# Altium footprint library PCB_Connector.PcbLib: 86 footprints (part 3 of 6)
Each footprint in its own frame and in the unit in brackets; x right, y up, seen from the top. Pads: shape width x height; smd on the part's side, far side on the other; paste and mask are expansions set on the pad; w line width, h text height; cw(c..) or ccw(c..) is an arc to the next point about the centre after c.
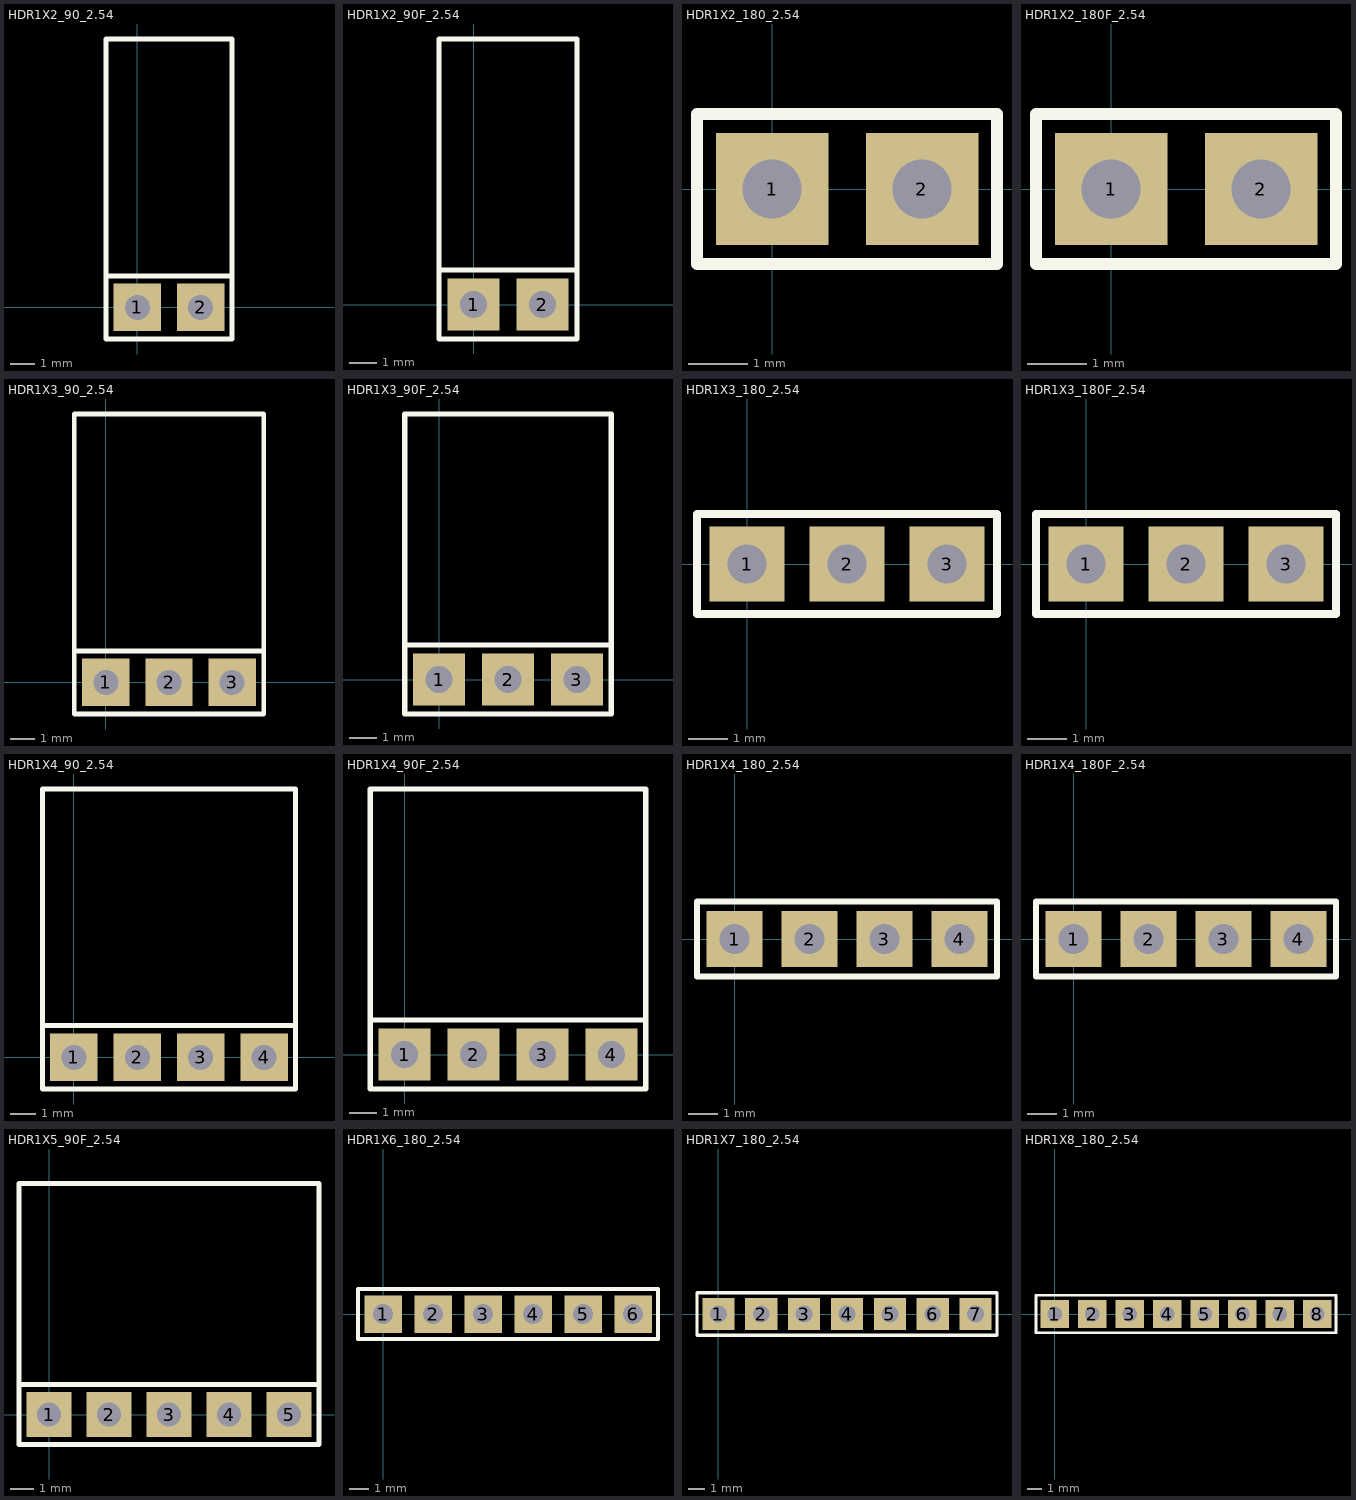
[diagram p2: the footprints below, top view; thin cyan lines are the x and y axes]

## HDR1X2_90_2.54 [mm] "Connector; Header; 2 Position"
height 4.3
pads (2):
  rect 1.905x1.905 hole 1: 1(0,0) 2(2.54,0)
Top Overlay:
  lines w0.2: -1.27,1.27 3.81,1.27 ; -1.27,-1.27 3.81,-1.27 3.81,10.795 -1.27,10.795 -1.27,-1.27
3D body: height 2.52, standoff -2.38, extent -1.17,-0.38 3.71,10.76

## HDR1X2_90F_2.54 [mm] "Connector; Header; 2 Position"
height 4.3
pads (2):
  rect 1.905x1.905 hole 1: 1(0,0) 2(2.54,0)
Top Overlay:
  lines w0.2: -1.27,1.27 3.81,1.27 ; -1.27,-1.27 3.81,-1.27 3.81,9.779 -1.27,9.779 -1.27,-1.27
3D body: height 2.52, standoff -3.18, extent -1.395,-0.163 3.935,9.897

## HDR1X2_180_2.54 [mm] "Connector; Header; 2 Position"
height 4.3
pads (2):
  rect 1.905x1.905 hole 1: 1(0,0) 2(2.54,0)
Top Overlay:
  lines w0.2: -1.27,-1.27 3.81,-1.27 3.81,1.27 -1.27,1.27 -1.27,-1.27
3D body: height 7.58, standoff -2.94, extent -1.27,-1.27 1.27,1.27
3D body: height 7.58, standoff -2.94, extent 1.27,-1.27 3.81,1.27

## HDR1X2_180F_2.54 [mm] "Connector; Header; 2 Position"
height 4.3
pads (2):
  rect 1.905x1.905 hole 1: 1(0,0) 2(2.54,0)
Top Overlay:
  lines w0.2: -1.27,-1.27 -1.27,1.27 3.81,1.27 3.81,-1.27 -1.27,-1.27
3D body: height 8.5, standoff -3.2, extent -1.395,-1.25 3.935,1.25

## HDR1X3_90_2.54 [mm] "Connector; Header; 3 Position"
height 4.3
pads (3):
  rect 1.905x1.905 hole 1: 1(0,0) 2(2.54,0) 3(5.08,0)
Top Overlay:
  lines w0.2: -1.27,1.27 6.35,1.27 ; -1.27,-1.27 -1.27,10.795 6.35,10.795 6.35,-1.27 -1.27,-1.27
3D body: height 2.52, standoff -2.38, extent -1.17,-0.38 6.25,10.76

## HDR1X3_90F_2.54 [mm] "Connector; Header; 2 Position"
height 4.3
pads (3):
  rect 1.905x1.905 hole 1: 1(0,0) 2(2.54,0) 3(5.08,0)
Top Overlay:
  lines w0.2: -1.27,1.27 6.35,1.27 ; -1.27,-1.27 3.81,-1.27 6.35,-1.27 6.35,9.779 -1.27,9.779 -1.27,-1.27
3D body: height 2.52, standoff -3.18, extent -1.395,-0.163 6.475,9.897

## HDR1X3_180_2.54 [mm] "Connector; Header; 3 Position"
height 4.3
pads (3):
  rect 1.905x1.905 hole 1: 1(0,0) 2(2.54,0) 3(5.08,0)
Top Overlay:
  lines w0.2: -1.27,-1.27 -1.27,1.27 6.35,1.27 6.35,-1.27 -1.27,-1.27
3D body: height 7.58, standoff -2.94, extent 1.27,-1.27 3.81,1.27
3D body: height 7.58, standoff -2.94, extent 3.81,-1.27 6.35,1.27
3D body: height 7.58, standoff -2.94, extent -1.27,-1.27 1.27,1.27

## HDR1X3_180F_2.54 [mm] "Connector; Header; 2 Position"
height 4.3
pads (3):
  rect 1.905x1.905 hole 1: 1(0,0) 2(2.54,0) 3(5.08,0)
Top Overlay:
  lines w0.2: -1.27,-1.27 -1.27,1.27 3.81,1.27 6.35,1.27 6.35,-1.27 3.81,-1.27 -1.27,-1.27
3D body: height 8.5, standoff -3.2, extent -1.395,-1.27 6.475,1.23

## HDR1X4_90_2.54 [mm] "Connector; Header; 4 Position"
height 4.3
pads (4):
  rect 1.905x1.905 hole 1: 1(0,0) 2(2.54,0) 3(5.08,0) 4(7.62,0)
Top Overlay:
  lines w0.2: -1.27,1.27 8.89,1.27 ; -1.27,-1.27 8.89,-1.27 8.89,10.76 -1.27,10.76 -1.27,-1.27
3D body: height 2.52, standoff -2.38, extent -1.17,-0.38 8.79,10.76

## HDR1X4_90F_2.54 [mm] "Connector; Header; 2 Position"
height 4.3
pads (4):
  rect 1.905x1.905 hole 1: 1(0,0) 2(2.54,0) 3(5.08,0) 4(7.62,0)
Top Overlay:
  lines w0.2: -1.27,1.27 8.89,1.27 ; -1.27,-1.27 3.81,-1.27 8.89,-1.27 8.89,9.779 3.81,9.779 -1.27,9.779 -1.27,-1.27
3D body: height 2.52, standoff -3.18, extent 3.685,-0.163 9.015,9.897
3D body: height 2.52, standoff -3.18, extent -1.395,-0.163 3.935,9.897

## HDR1X4_180_2.54 [mm] "Connector; Header; 4 Position"
height 4.3
pads (4):
  rect 1.905x1.905 hole 1: 1(0,0) 2(2.54,0) 3(5.08,0) 4(7.62,0)
Top Overlay:
  lines w0.2: -1.27,-1.27 8.89,-1.27 8.89,1.27 -1.27,1.27 -1.27,-1.27
3D body: height 7.58, standoff -2.94, extent 1.27,-1.27 3.81,1.27
3D body: height 7.58, standoff -2.94, extent -1.27,-1.27 1.27,1.27
3D body: height 7.58, standoff -2.94, extent 3.81,-1.27 6.35,1.27
3D body: height 7.58, standoff -2.94, extent 6.35,-1.27 8.89,1.27

## HDR1X4_180F_2.54 [mm] "Connector; Header; 2 Position"
height 4.3
pads (4):
  rect 1.905x1.905 hole 1: 1(0,0) 2(2.54,0) 3(5.08,0) 4(7.62,0)
Top Overlay:
  lines w0.2: -1.27,-1.27 -1.27,1.27 3.81,1.27 8.89,1.27 8.89,-1.27 3.81,-1.27 -1.27,-1.27
3D body: height 8.5, standoff -3.2, extent 3.685,-1.25 9.015,1.25
3D body: height 8.5, standoff -3.2, extent -1.395,-1.25 3.935,1.25

## HDR1X5_90F_2.54 [mm]
height 4.3
pads (5):
  rect 1.905x1.905 hole 1: 1(0,0) 2(2.54,0) 3(5.08,0) 4(7.62,0) 5(10.16,0)
Top Overlay:
  lines w0.2: -1.27,1.27 11.43,1.27 ; -1.27,-1.27 -1.27,9.779 6.35,9.779 11.43,9.779 11.43,-1.27 6.35,-1.27 3.81,-1.27 -1.27,-1.27
3D body: height 2.52, standoff -3.18, extent -1.395,-0.163 6.475,9.897
3D body: height 2.52, standoff -3.18, extent 6.225,-0.163 11.555,9.897

## HDR1X6_180_2.54 [mm] "Connector; Header; 6 Position"
height 4.3
pads (6):
  rect 1.905x1.905 hole 1: 1(0,0) 2(2.54,0) 3(5.08,0) 4(7.62,0) 5(10.16,0) 6(12.7,0)
Top Overlay:
  lines w0.2: -1.27,-1.27 13.97,-1.27 13.97,1.27 -1.27,1.27 -1.27,-1.27
3D body: height 7.58, standoff -2.94, extent 11.43,-1.27 13.97,1.27
3D body: height 7.58, standoff -2.94, extent 8.89,-1.27 11.43,1.27
3D body: height 7.58, standoff -2.94, extent 6.35,-1.27 8.89,1.27
3D body: height 7.58, standoff -2.94, extent 3.81,-1.27 6.35,1.27
3D body: height 7.58, standoff -2.94, extent 1.27,-1.27 3.81,1.27
3D body: height 7.58, standoff -2.94, extent -1.27,-1.27 1.27,1.27

## HDR1X7_180_2.54 [mm] "Connector; Header; 6 Position"
height 4.3
pads (7):
  rect 1.905x1.905 hole 1: 1(0,0) 2(2.54,0) 3(5.08,0) 4(7.62,0) 5(10.16,0) 6(12.7,0) 7(15.24,0)
Top Overlay:
  lines w0.2: -1.27,-1.27 -1.27,1.27 16.51,1.27 16.51,-1.27 -1.27,-1.27
3D body: height 7.58, standoff -2.94, extent 13.97,-1.27 16.51,1.27
3D body: height 7.58, standoff -2.94, extent -1.27,-1.27 1.27,1.27
3D body: height 7.58, standoff -2.94, extent 1.27,-1.27 3.81,1.27
3D body: height 7.58, standoff -2.94, extent 3.81,-1.27 6.35,1.27
3D body: height 7.58, standoff -2.94, extent 6.35,-1.27 8.89,1.27
3D body: height 7.58, standoff -2.94, extent 8.89,-1.27 11.43,1.27
3D body: height 7.58, standoff -2.94, extent 11.43,-1.27 13.97,1.27

## HDR1X8_180_2.54 [mm] "Connector; Header; 8 Position"
height 4.3
pads (8):
  rect 1.905x1.905 hole 1: 1(0,0) 2(2.54,0) 3(5.08,0) 4(7.62,0) 5(10.16,0) 6(12.7,0) 7(15.24,0) 8(17.78,0)
Top Overlay:
  lines w0.2: -1.27,-1.27 19.05,-1.27 19.05,1.27 -1.27,1.27 -1.27,-1.27
3D body: height 7.58, standoff -2.94, extent 16.51,-1.27 19.05,1.27
3D body: height 7.58, standoff -2.94, extent 13.97,-1.27 16.51,1.27
3D body: height 7.58, standoff -2.94, extent 11.43,-1.27 13.97,1.27
3D body: height 7.58, standoff -2.94, extent 8.89,-1.27 11.43,1.27
3D body: height 7.58, standoff -2.94, extent 6.35,-1.27 8.89,1.27
3D body: height 7.58, standoff -2.94, extent 3.81,-1.27 6.35,1.27
3D body: height 7.58, standoff -2.94, extent 1.27,-1.27 3.81,1.27
3D body: height 7.58, standoff -2.94, extent -1.27,-1.27 1.27,1.27